# Altium footprint library CeleronLib_THD.PcbLib: 217 footprints (part 13 of 14)
Each footprint in its own frame and in the unit in brackets; x right, y up, seen from the top. Pads: shape width x height; smd on the part's side, far side on the other; paste and mask are expansions set on the pad; w line width, h text height; cw(c..) or ccw(c..) is an arc to the next point about the centre after c.
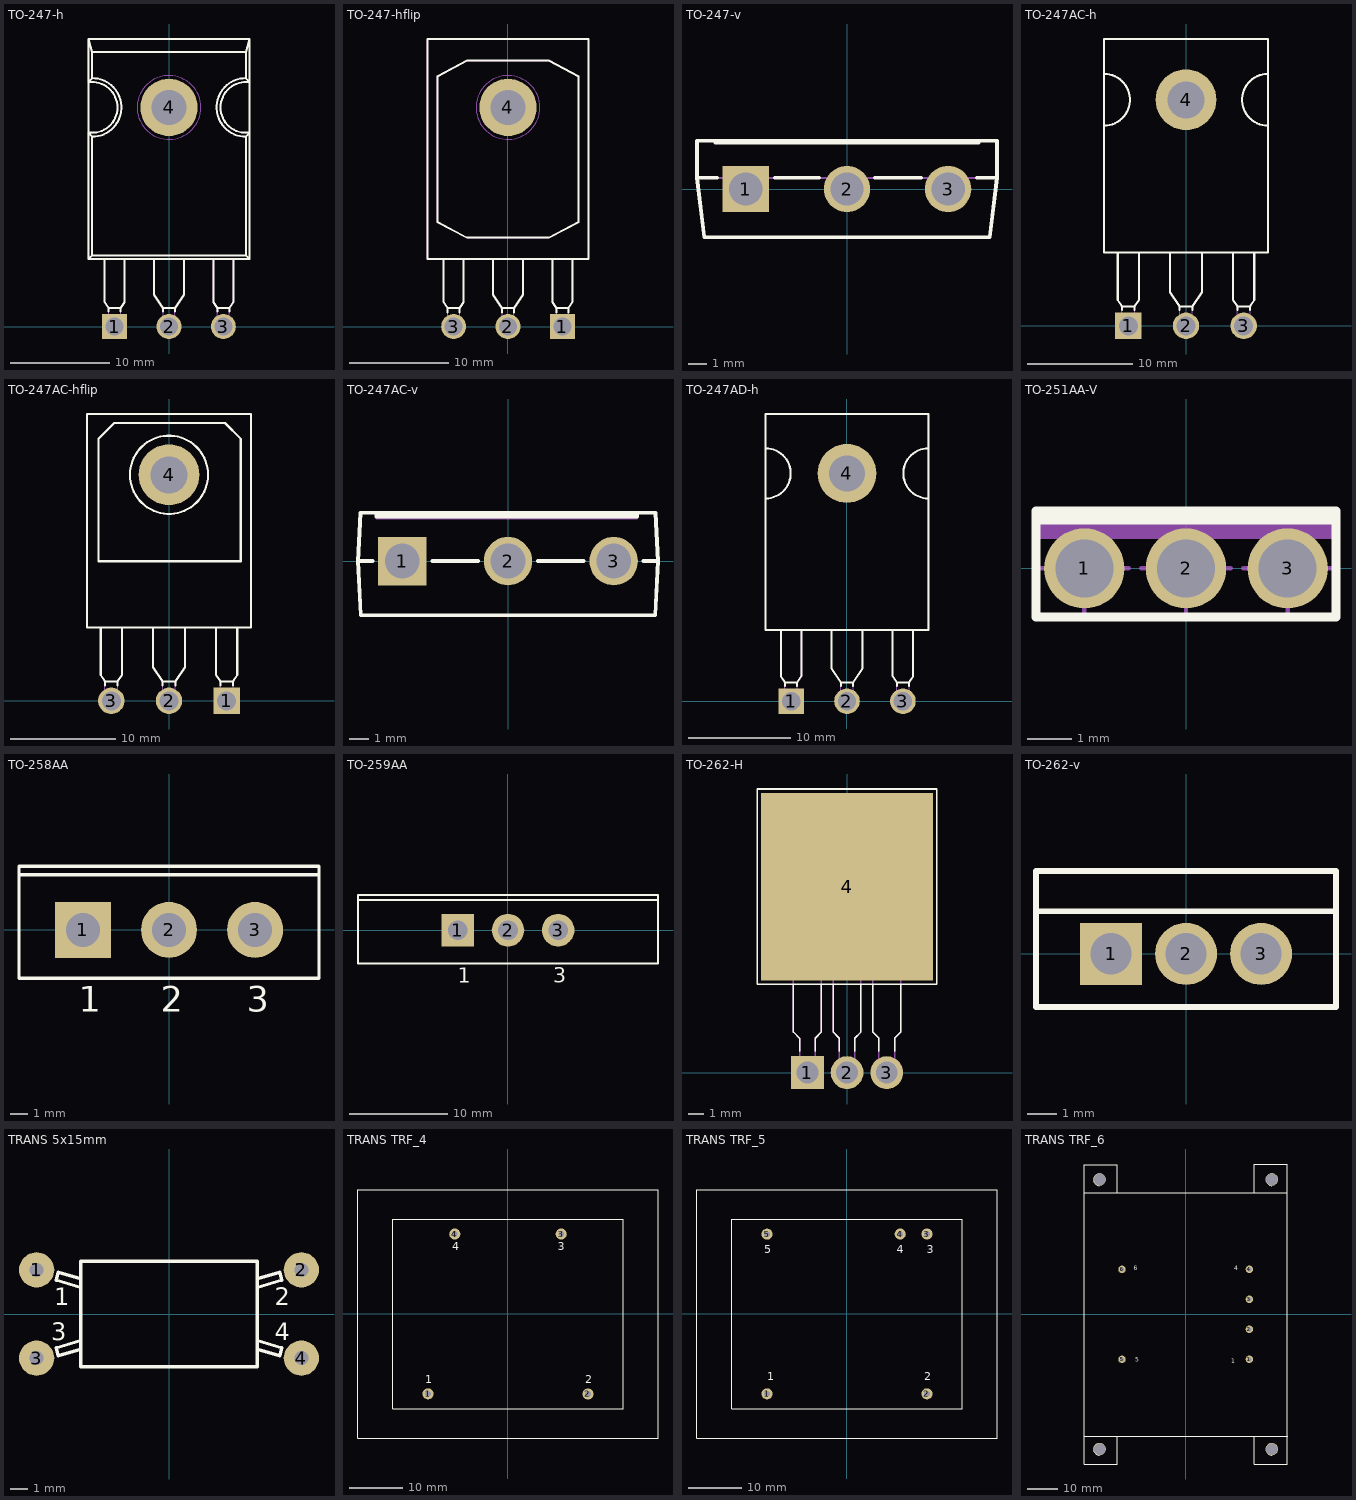
[diagram p12: the footprints below, top view; thin cyan lines are the x and y axes]

## TO-247-h [mm] "TO-247 3-Terminal - Horizontal Mount"
height 5.26
pads (4):
  rect 2.5x2.5 hole 1.8: 1(-5.46,0)
  round 2.5 hole 1.8: 2(0,0) 3(5.46,0)
  round 5.75 hole 3.5: 4(0,22)
Top Overlay:
  lines w0.2: -6.46,6.76 -6.46,2.44 -6.06,1.84 ; -6.06,1.5 -6.06,1.84 ; -4.86,1.5 -4.86,1.84 ; -4.46,6.76 -4.46,2.44 -4.86,1.84 ; -1.5,6.76 -1.5,3.19 -0.6,1.84 ; -0.6,1.5 -0.6,1.84 ; 0.6,1.5 0.6,1.84 ; 1.5,6.76 1.5,3.19 0.6,1.84 ; 4.46,6.76 4.46,2.44 4.86,1.84 ; 4.86,1.5 4.86,1.84 ; 6.06,1.5 6.06,1.84 ; 6.46,6.76 6.46,2.44 6.06,1.84 ; 8.1,19.45 7.71,19.06 ; 8.1,19.49 cw(c7.71,22) 8.1,24.51 7.71,24.94 ; 8.1,28.86 7.71,27.567 ; -8.1,6.76 -8.1,28.86 ; -8.1,6.76 -7.71,7.153 ; -8.1,6.76 8.1,6.76 ; -8.1,28.86 -7.71,27.567 ; -8.1,28.86 8.103,28.869 8.1,6.76 ; -7.71,7.153 -7.71,19.06 ; -7.71,7.153 7.71,7.153 ; -7.71,19.06 ccw(c-7.71,22) -7.71,24.94 ; -7.71,19.06 -8.1,19.49 ccw(c-7.71,22) -8.1,24.51 -7.71,24.94 ; -7.71,24.94 -7.71,27.567 ; -7.71,27.567 7.71,27.567 ; -6.06,1.84 -4.86,1.84 ; -0.6,1.84 0.6,1.84 ; 4.86,1.84 6.06,1.84 ; 7.71,7.153 8.1,6.76 ; 7.71,7.153 7.71,19.06 ; 7.71,19.06 cw(c7.71,22) 7.71,24.94 ; 7.71,24.94 7.71,27.567
Mechanical 8:
  lines w0.1: -6.46,0 -5.46,0 ; -5.46,-1 -5.46,0 ; -5.46,1 -5.46,0 ; -4.46,0 -5.46,0 ; -1,0 0,0 ; -1,22 0,22 ; 0,-1 0,0 ; 0,1 0,0 ; 0,21 0,22 ; 0,23 0,22 ; 1,0 0,0 ; 1,22 0,22 ; 4.46,0 5.46,0 ; 5.46,-1 5.46,0 ; 5.46,1 5.46,0 ; 6.46,0 5.46,0
Top Assy:
  circle w0.1: c0,22 r3.202
  lines w0.1: -6.46,6.76 -6.46,2.44 -6.06,1.84 ; -4.46,6.76 -4.46,2.44 -4.86,1.84 ; -1.5,6.76 -1.5,3.19 -0.6,1.84 ; 1.5,6.76 1.5,3.19 0.6,1.84 ; 4.46,6.76 4.46,2.44 4.86,1.84 ; 6.46,6.76 6.46,2.44 6.06,1.84 ; 8.103,28.869 -8.1,28.86 ; -8.1,6.76 -7.71,7.153 ; -8.1,6.76 -8.1,19.49 ; -8.1,6.76 8.1,6.76 ; -8.1,19.49 ccw(c-7.71,22) -8.1,24.51 ; -8.1,19.49 -7.71,19.06 ; -8.1,24.51 -7.71,24.94 ; -8.1,24.51 -8.1,28.86 ; -8.1,28.86 -7.71,27.567 ; -7.71,7.153 -7.71,19.06 ; -7.71,7.153 7.71,7.153 ; -7.71,19.06 ccw(c-7.71,22) -7.71,24.94 ; -7.71,24.94 -7.71,27.567 ; -7.71,27.567 7.71,27.567 ; -6.06,1.84 -6.06,-0.5 -4.86,-0.5 -4.86,1.84 ; -6.06,1.84 -4.86,1.84 ; -0.6,1.84 -0.6,-0.5 0.6,-0.5 0.6,1.84 ; -0.6,1.84 0.6,1.84 ; 4.86,1.84 4.86,-0.5 6.06,-0.5 6.06,1.84 ; 4.86,1.84 6.06,1.84 ; 7.71,7.153 8.1,6.76 ; 7.71,7.153 7.71,19.06 ; 7.71,19.06 cw(c7.71,22) 7.71,24.94 ; 7.71,19.06 8.1,19.49 ; 7.71,24.94 8.1,24.51 ; 7.71,24.94 7.71,27.567 ; 7.71,27.567 8.1,28.86 8.1,24.51 ; 8.1,6.76 8.1,19.49 ; 8.1,19.49 cw(c7.71,22) 8.1,24.51
3D body: height 5.2, standoff -3.8, extent -8.1,-0.5 8.1,28.86

## TO-247-hflip [mm] "TO-247 3-Terminal - Flipped Horizontal Mount"
height 5.26
pads (4):
  rect 2.5x2.5 hole 1.8: 1(5.46,0)
  round 2.5 hole 1.8: 2(0,0) 3(-5.46,0)
  round 5.75 hole 3.5: 4(0,22)
Top Overlay:
  lines w0.2: -6.46,6.76 -6.46,2.44 -6.06,1.84 ; -6.06,1.429 -6.06,1.84 ; -4.86,1.429 -4.86,1.84 ; -4.46,6.76 -4.46,2.44 -4.86,1.84 ; -1.5,6.76 -1.5,3.19 -0.6,1.84 ; -0.6,1.429 -0.6,1.84 ; 0.6,1.429 0.6,1.84 ; 1.5,6.76 1.5,3.19 0.6,1.84 ; 4.46,6.76 4.46,2.44 4.86,1.84 ; 4.86,1.429 4.86,1.84 ; 6.06,1.429 6.06,1.84 ; 6.46,6.76 6.46,2.44 6.06,1.84 ; 8.1,28.869 8.1,6.76 -8.1,6.76 -8.1,28.86 8.103,28.869 ; -6.06,1.84 -4.86,1.84 ; -0.6,1.84 0.6,1.84 ; 4.86,1.84 6.06,1.84 ; -7.1,10.51 -7.1,25.11 -4.1,26.7 4.1,26.7 7.1,25.11 7.1,10.51 4.1,8.92 -4.1,8.92 -7.1,10.51
Mechanical 8:
  lines w0.1: -5.46,0 -5.46,1 -5.46,0 ; -5.46,0 -5.46,-1 -5.46,0 ; -5.46,0 -4.46,0 -5.46,0 ; -5.46,0 -6.46,0 -5.46,0 ; 0,0 0,1 0,0 ; 0,0 0,-1 0,0 ; 0,0 1,0 0,0 ; 0,0 -1,0 0,0 ; 0,22 0,23 0,22 ; 0,22 0,21 0,22 ; 0,22 1,22 0,22 ; 0,22 -1,22 0,22 ; 5.46,0 5.46,1 5.46,0 ; 5.46,0 5.46,-1 5.46,0 ; 5.46,0 6.46,0 5.46,0 ; 5.46,0 4.46,0 5.46,0
Top Assy:
  circle w0.1: c0,22 r3.202
  lines w0.1: -6.46,6.76 -6.46,2.44 -6.06,1.84 ; -4.46,6.76 -4.46,2.44 -4.86,1.84 ; -1.5,6.76 -1.5,3.19 -0.6,1.84 ; 1.5,6.76 1.5,3.19 0.6,1.84 ; 4.46,6.76 4.46,2.44 4.86,1.84 ; 6.46,6.76 6.46,2.44 6.06,1.84 ; 8.1,28.869 8.1,6.76 -8.1,6.76 -8.1,28.86 8.103,28.869 ; -6.06,1.84 -6.06,-0.5 -4.86,-0.5 -4.86,1.84 ; -6.06,1.84 -4.86,1.84 ; -0.6,1.84 -0.6,-0.5 0.6,-0.5 0.6,1.84 ; -0.6,1.84 0.6,1.84 ; 4.86,1.84 4.86,-0.5 6.06,-0.5 6.06,1.84 ; 4.86,1.84 6.06,1.84 ; -7.1,10.51 -7.1,25.11 -4.1,26.7 4.1,26.7 7.1,25.11 7.1,10.51 4.1,8.92 -4.1,8.92 -7.1,10.51
3D body: height 5.2, standoff -3.8, extent -8.1,-0.5 8.1,28.86

## TO-247-v [mm] "TO-247 3-Terminal - Vertical Mount"
height 25
pads (3):
  rect 2.5x2.5 hole 1.8: 1(-5.46,0)
  round 2.5 hole 1.8: 2(0,0) 3(5.46,0)
Top Overlay:
  lines w0.2: -7.1,2.6 -7.1,2.5 7.1,2.5 7.1,2.6 ; -7,0.6 -8.1,0.6 ; -3.9,0.6 -1.5,0.6 ; 1.5,0.6 4,0.6 ; 7,0.6 8.1,0.6 ; -8.1,0.6 -7.71,-2.6 7.71,-2.6 8.1,0.6 ; -8.1,0.6 -8.1,2.6 8.1,2.6 8.1,0.6
Mechanical 8:
  lines w0.1: -6.46,0 -5.46,0 ; -5.46,-1 -5.46,0 ; -5.46,1 -5.46,0 ; -4.46,0 -5.46,0 ; -1,0 0,0 ; 0,-1 0,0 ; 0,1 0,0 ; 1,0 0,0 ; 4.46,0 5.46,0 ; 5.46,-1 5.46,0 ; 5.46,1 5.46,0 ; 6.46,0 5.46,0
Top Assy:
  lines w0.1: -7.1,2.6 -7.1,2.5 7.1,2.5 7.1,2.6 ; -8.1,0.6 8.1,0.6 ; -8.1,0.6 -7.71,-2.6 7.71,-2.6 8.1,0.6 ; -8.1,0.6 -8.1,2.6 8.1,2.6 8.1,0.6
3D body: height 27.02, standoff -3.6, extent -8.1,-2.6 8.1,2.6

## TO-247AC-h [mm] "TO-247AC 3-Terminal - Horizontal Mount"
height 5.3
pads (4):
  rect 2.5x2.5 hole 1.8: 1(-5.46,0)
  round 2.5 hole 1.8: 2(0,0) 3(5.46,0)
  round 5.75 hole 3.5: 4(0,21.39)
Top Overlay:
  lines w0.2: -7.75,18.94 ccw(c-7.75,21.39) -7.75,23.84 ; -6.46,6.94 -6.46,2.44 -6.06,1.84 ; -6.06,1.5 -6.06,1.84 ; -4.86,1.5 -4.86,1.84 ; -4.46,6.94 -4.46,2.44 -4.86,1.84 ; -1.5,6.94 -1.5,3.19 -0.6,1.84 ; -0.6,1.5 -0.6,1.84 ; 0.6,1.5 0.6,1.84 ; 1.5,6.94 1.5,3.19 0.6,1.84 ; 4.46,6.94 4.46,2.44 4.86,1.84 ; 4.86,1.5 4.86,1.84 ; 6.06,1.5 6.06,1.84 ; 6.46,6.94 6.46,2.44 6.06,1.84 ; 7.75,18.94 cw(c7.75,21.39) 7.75,23.84 ; -6.06,1.84 -4.86,1.84 ; -0.6,1.84 0.6,1.84 ; 4.86,1.84 6.06,1.84 ; -7.75,6.94 7.75,6.94 7.75,27.14 -7.75,27.14 -7.75,6.94
Mechanical 8:
  lines w0.1: -5.96,0 -5.46,0 ; -5.46,-0.5 -5.46,0 ; -5.46,0.5 -5.46,0 ; -4.96,0 -5.46,0 ; -0.5,0 0,0 ; -0.5,21.39 0,21.39 ; 0,-0.5 0,0 ; 0,0.5 0,0 ; 0,20.89 0,21.39 ; 0,21.89 0,21.39 ; 0.5,0 0,0 ; 0.5,21.39 0,21.39 ; 4.96,0 5.46,0 ; 5.46,-0.5 5.46,0 ; 5.46,0.5 5.46,0 ; 5.96,0 5.46,0
Top Assy:
  circle w0.1: c0,21.39 r1.75
  lines w0.1: -7.75,18.94 ccw(c-7.75,21.39) -7.75,23.84 ; -6.46,6.94 -6.46,2.44 -6.06,1.84 ; -4.46,6.94 -4.46,2.44 -4.86,1.84 ; -1.5,6.94 -1.5,3.19 -0.6,1.84 ; 1.5,6.94 1.5,3.19 0.6,1.84 ; 4.46,6.94 4.46,2.44 4.86,1.84 ; 6.46,6.94 6.46,2.44 6.06,1.84 ; 7.75,18.94 cw(c7.75,21.39) 7.75,23.84 ; -6.06,1.84 -6.06,-0.5 -4.86,-0.5 -4.86,1.84 ; -6.06,1.84 -4.86,1.84 ; -0.6,1.84 -0.6,-0.5 0.6,-0.5 0.6,1.84 ; -0.6,1.84 0.6,1.84 ; 4.86,1.84 6.06,1.84 ; 4.86,1.84 4.86,-0.5 6.06,-0.5 6.06,1.84 ; -7.75,6.94 -7.75,27.14 7.75,27.14 7.75,6.94 -7.75,6.94
3D body: height 5.3, standoff -3.9, extent -7.75,-0.5 7.75,27.14

## TO-247AC-hflip [mm] "TO-247AC 3-Terminal - Flipped Horizontal Mount"
height 5.3
pads (4):
  rect 2.5x2.5 hole 1.8: 1(5.46,0)
  round 2.5 hole 1.8: 2(0,0) 3(-5.46,0)
  round 5.75 hole 3.5: 4(0,21.39)
Top Overlay:
  circle w0.2: c0,21.39 r3.7
  lines w0.2: -6.46,6.94 -6.46,2.44 -6.06,1.84 ; -6.06,1.429 -6.06,1.84 ; -4.86,1.429 -4.86,1.84 ; -4.46,6.94 -4.46,2.44 -4.86,1.84 ; -1.5,6.94 -1.5,3.19 -0.6,1.84 ; -0.6,1.429 -0.6,1.84 ; 0.6,1.429 0.6,1.84 ; 1.5,6.94 1.5,3.19 0.6,1.84 ; 4.46,6.94 4.46,2.44 4.86,1.84 ; 4.86,1.429 4.86,1.84 ; 6.06,1.429 6.06,1.84 ; 6.46,6.94 6.46,2.44 6.06,1.84 ; -6.06,1.84 -4.86,1.84 ; -0.6,1.84 0.6,1.84 ; 4.86,1.84 6.06,1.84 ; -7.75,6.94 -7.75,27.14 7.75,27.14 7.75,6.94 -7.75,6.94 ; -6.665,13.21 -6.665,24.79 -5.165,26.29 5.295,26.29 6.795,24.79 6.795,13.21 -6.665,13.21
Mechanical 8:
  lines w0.1: -5.96,0 -5.46,0 ; -5.46,-0.5 -5.46,0 ; -5.46,0.5 -5.46,0 ; -4.96,0 -5.46,0 ; -0.5,0 0,0 ; -0.5,21.39 0,21.39 ; 0,-0.5 0,0 ; 0,0.5 0,0 ; 0,20.89 0,21.39 ; 0,21.89 0,21.39 ; 0.5,0 0,0 ; 0.5,21.39 0,21.39 ; 4.96,0 5.46,0 ; 5.46,-0.5 5.46,0 ; 5.46,0.5 5.46,0 ; 5.96,0 5.46,0
Top Assy:
  circle w0.1: c0,21.39 r1.75
  circle w0.1: c0,21.39 r3.7
  lines w0.1: -6.46,6.94 -6.46,2.44 -6.06,1.84 ; -4.46,6.94 -4.46,2.44 -4.86,1.84 ; -1.5,6.94 -1.5,3.19 -0.6,1.84 ; 1.5,6.94 1.5,3.19 0.6,1.84 ; 4.46,6.94 4.46,2.44 4.86,1.84 ; 6.46,6.94 6.46,2.44 6.06,1.84 ; -6.06,1.84 -6.06,-0.5 -4.86,-0.5 -4.86,1.84 ; -6.06,1.84 -4.86,1.84 ; -0.6,1.84 -0.6,-0.5 0.6,-0.5 0.6,1.84 ; -0.6,1.84 0.6,1.84 ; 4.86,1.84 6.06,1.84 ; 4.86,1.84 4.86,-0.5 6.06,-0.5 6.06,1.84 ; -7.75,6.94 -7.75,27.14 7.75,27.14 7.75,6.94 -7.75,6.94 ; -6.665,13.21 -6.665,24.79 -5.165,26.29 5.295,26.29 6.795,24.79 6.795,13.21 -6.665,13.21
3D body: height 5.3, standoff -3.6, extent -7.75,-0.5 7.75,27.14

## TO-247AC-v [mm] "TO-247AC 3-Terminal - Vertical Mount"
height 25
pads (3):
  rect 2.5x2.5 hole 1.8: 1(-5.46,0)
  round 2.5 hole 1.8: 2(0,0) 3(5.46,0)
Top Overlay:
  lines w0.2: -7.728,0 -7.01,0 ; -6.795,2.5 -6.795,2.3 6.665,2.3 6.665,2.5 ; -3.91,0 -1.55,0 ; 1.55,0 3.91,0 ; 7.01,0 7.75,0 ; 7.75,0 7.61,-2.8 -7.61,-2.8 -7.75,0 -7.62,2.5 7.62,2.5 7.75,0
Mechanical 8:
  lines w0.1: -5.96,0 -5.46,0 ; -5.46,-0.5 -5.46,0 ; -5.46,0.5 -5.46,0 ; -4.96,0 -5.46,0 ; -0.5,0 0,0 ; 0,-0.5 0,0 ; 0,0.5 0,0 ; 0.5,0 0,0 ; 4.96,0 5.46,0 ; 5.46,-0.5 5.46,0 ; 5.46,0.5 5.46,0 ; 5.96,0 5.46,0
Top Assy:
  lines w0.1: -6.795,2.3 6.665,2.3 ; -6.795,2.4 6.665,2.4 ; -6.795,2.5 -6.795,2.2 6.665,2.2 6.665,2.5 ; -7.75,0 -7.61,-2.8 7.61,-2.8 7.75,0 7.62,2.5 -7.62,2.5 -7.75,0
3D body: height 26.75, standoff -3.6, extent -7.75,-2.8 7.75,2.5

## TO-247AD-h [mm] "TO-247AD 3-Terminal - Horizontal Mount"
height 5.3
pads (4):
  rect 2.5x2.5 hole 1.8: 1(-5.46,0)
  round 2.5 hole 1.8: 2(0,0) 3(5.46,0)
  round 5.75 hole 3.5: 4(0,22.24)
Top Overlay:
  lines w0.2: -7.95,19.79 ccw(c-7.95,22.24) -7.95,24.69 ; -6.46,6.94 -6.46,2.44 -6.06,1.84 ; -6.06,1.5 -6.06,1.84 ; -4.86,1.5 -4.86,1.84 ; -4.46,6.94 -4.46,2.44 -4.86,1.84 ; -1.5,6.94 -1.5,3.19 -0.6,1.84 ; -0.6,1.5 -0.6,1.84 ; 0.6,1.5 0.6,1.84 ; 1.5,6.94 1.5,3.19 0.6,1.84 ; 4.46,6.94 4.46,2.44 4.86,1.84 ; 4.86,1.5 4.86,1.84 ; 6.06,1.5 6.06,1.84 ; 6.46,6.94 6.46,2.44 6.06,1.84 ; 7.95,19.79 cw(c7.95,22.24) 7.95,24.69 ; -6.06,1.84 -4.86,1.84 ; -0.6,1.84 0.6,1.84 ; 4.86,1.84 6.06,1.84 ; -7.95,6.94 7.95,6.94 7.95,28.04 -7.95,28.04 -7.95,6.94
Mechanical 8:
  lines w0.1: -5.96,0 -5.46,0 ; -5.46,-0.5 -5.46,0 ; -5.46,0.5 -5.46,0 ; -4.96,0 -5.46,0 ; -0.5,0 0,0 ; -0.5,22.24 0,22.24 ; 0,-0.5 0,0 ; 0,0.5 0,0 ; 0,21.74 0,22.24 ; 0,22.74 0,22.24 ; 0.5,0 0,0 ; 0.5,22.24 0,22.24 ; 4.96,0 5.46,0 ; 5.46,-0.5 5.46,0 ; 5.46,0.5 5.46,0 ; 5.96,0 5.46,0
Top Assy:
  circle w0.1: c0,22.24 r1.75
  lines w0.1: -7.95,19.79 ccw(c-7.95,22.24) -7.95,24.69 ; -6.46,6.94 -6.46,2.44 -6.06,1.84 ; -4.46,6.94 -4.46,2.44 -4.86,1.84 ; -1.5,6.94 -1.5,3.19 -0.6,1.84 ; 1.5,6.94 1.5,3.19 0.6,1.84 ; 4.46,6.94 4.46,2.44 4.86,1.84 ; 6.46,6.94 6.46,2.44 6.06,1.84 ; 7.95,19.79 cw(c7.95,22.24) 7.95,24.69 ; -6.06,1.84 -4.86,1.84 ; -6.06,1.84 -6.06,-0.5 -4.86,-0.5 -4.86,1.84 ; -0.6,1.84 0.6,1.84 ; -0.6,1.84 -0.6,-0.5 0.6,-0.5 0.6,1.84 ; 4.86,1.84 4.86,-0.5 6.06,-0.5 6.06,1.84 ; 4.86,1.84 6.06,1.84 ; -7.95,6.94 7.95,6.94 7.95,28.04 -7.95,28.04 -7.95,6.94
3D body: height 5.3, standoff -3.9, extent -7.95,-0.5 7.95,28.04

## TO-251AA-V [mm] "TO-251AA 3-Terminal - Vertical Mount"
height 10.5
pads (3):
  round 1.8 hole 1.3: 1(-2.28,0) 2(0,0) 3(2.28,0)
Top Overlay:
  lines w0.2: -3.365,1.09 3.365,1.09 ; -3.365,-1.09 -3.365,1.29 3.365,1.29 3.365,-1.09 -3.365,-1.09
Mechanical 8:
  lines w0.1: -3.28,0 -2.28,0 ; -2.28,-1 -2.28,0 ; -2.28,1 -2.28,0 ; -1.28,0 -2.28,0 ; -1,0 0,0 ; 0,-1 0,0 ; 0,1 0,0 ; 1,0 0,0 ; 1.28,0 2.28,0 ; 2.28,-1 2.28,0 ; 2.28,1 2.28,0 ; 3.28,0 2.28,0
Top Assy:
  lines w0.1: -3.365,0.71 3.365,0.71 ; -3.365,0.79 3.365,0.79 ; -3.365,0.89 3.365,0.89 ; -3.365,0.99 3.365,0.99 ; -3.365,1.09 3.365,1.09 ; -3.365,1.19 3.365,1.19 ; -3.365,-1.09 3.365,-1.09 3.365,1.29 -3.365,1.29 -3.365,-1.09
3D body: height 10.49, standoff -3.2, extent -3.365,-1.09 3.365,1.29

## TO-258AA [mm] "TO, Thru-Hole, Vertical, Heatsink Mounted; 3 In-Line Leads; Pitch 5.08 mm"
height 21
pads (3):
  rect 3.3x3.3 hole 2: 1(-5.08,0)
  round 3.3 hole 2: 2(0,0) 3(5.08,0)
Top Overlay:
  lines w0.2: -8.85,3.25 8.85,3.25 ; -8.85,-2.85 -8.85,3.75 8.85,3.75 8.85,-2.85 -8.85,-2.85
  text "3" at 4.58,-4.825 h1.5
  text "2" at -0.5,-4.825 h1.5
  text "1" at -5.33,-4.825 h1.5

## TO-259AA [mm] "SIP; 3 Leads; Body 13.7 x 30.2 x 6.5 mm (typ); Pitch 5.08 mm"
height 14
pads (3):
  rect 3.3x3.3 hole 2: 1(-5.08,0)
  round 3.3 hole 2: 2(0,0) 3(5.08,0)
Top Overlay:
  lines w0.2: -15.2,3.05 15.2,3.05 ; -15.2,-3.35 -15.2,3.55 15.2,3.55 15.2,-3.35 -15.2,-3.35
  text "3" at 4.572,-5.33 h1.5
  text "1" at -5.08,-5.33 h1.5

## TO-262-H [mm] "TO-262 3-Terminal + Tab - Horizontal Mount"
height 4.83
pads (4):
  rect 2.1x2.1 hole 1.4: 1(-2.54,0)
  round 2.1 hole 1.4: 2(0,0) 3(2.54,0)
  rect 11x12 smd paste-5.5: 4(-0.002,11.898)
Top Overlay:
  lines w0.1: -3.43,5.648 -3.43,2.59 -3.04,2.2 -3.04,1.361 ; -2.04,1.361 -2.04,2.2 -1.65,2.59 -1.65,5.648 ; -0.89,5.648 -0.89,2.59 -0.5,2.2 -0.5,1.361 ; 0.5,1.361 0.5,2.2 0.89,2.59 0.89,5.648 ; 1.65,5.648 1.65,2.59 2.04,2.2 2.04,1.361 ; 3.04,1.361 3.04,2.2 3.43,2.59 3.43,5.648 ; -5.752,5.648 -5.752,18.148 5.748,18.148 5.748,5.648 -5.752,5.648
Mechanical 8:
  lines w0.1: -3.04,0 -2.54,0 ; -2.54,-0.5 -2.54,0 ; -2.54,0.5 -2.54,0 ; -2.04,0 -2.54,0 ; -0.5,0 0,0 ; 0,-0.5 0,0 ; 0,0.5 0,0 ; 0.5,0 0,0 ; 2.04,0 2.54,0 ; 2.54,-0.5 2.54,0 ; 2.54,0.5 2.54,0 ; 3.04,0 2.54,0
  text "This Pad" at -3.8,9.75 h1
  text "Mask on" at -3.5,11.425 h1
  text "No Paste" at -3.725,13 h1
Top 3D:
  lines w0.2: -5.083,6.7 -5.083,6.3 -4.5,6.3
Top Assy:
  lines w0.1: -5.083,15.815 5.077,15.815 ; -3.43,6.3 -3.43,2.59 -3.04,2.2 -3.04,-0.25 -2.04,-0.25 -2.04,2.2 -1.65,2.59 -1.65,6.3 ; -0.89,6.3 -0.89,2.59 -0.5,2.2 -0.5,-0.25 0.5,-0.25 0.5,2.2 0.89,2.59 0.89,6.3 ; 1.65,6.3 1.65,2.59 2.04,2.2 2.04,-0.25 3.04,-0.25 3.04,2.2 3.43,2.59 3.43,6.3 ; -5.083,6.3 -5.083,16.86 -3.338,17.495 3.333,17.495 5.077,16.86 5.077,6.3 -5.083,6.3
3D body: height 4.6, standoff -3.6, extent -5.082,-0.25 5.078,17.495

## TO-262-v [mm] "TO-262 3-Terminal - Vertical Mount"
height 15.01
pads (3):
  rect 2.1x2.1 hole 1.4: 1(-2.54,0)
  round 2.1 hole 1.4: 2(0,0) 3(2.54,0)
Top Overlay:
  lines w0.2: -5.082,1.445 5.078,1.445 ; -5.082,-1.795 5.078,-1.795 5.078,2.805 -5.082,2.805 -5.082,-1.795
Mechanical 8:
  lines w0.1: -3.04,0 -2.54,0 ; -2.54,-0.5 -2.54,0 ; -2.54,0.5 -2.54,0 ; -2.04,0 -2.54,0 ; -0.5,0 0,0 ; 0,-0.5 0,0 ; 0,0.5 0,0 ; 0.5,0 0,0 ; 2.04,0 2.54,0 ; 2.54,-0.5 2.54,0 ; 2.54,0.5 2.54,0 ; 3.04,0 2.54,0
Top Assy:
  lines w0.1: -5.082,1.445 5.078,1.445 ; -5.082,-1.795 5.078,-1.795 5.078,2.805 -5.082,2.805 -5.082,-1.795
3D body: height 15.3, standoff -3.6, extent -5.082,-1.795 5.078,2.805

## TRANS 5x15mm [mm] "Transformer; 4 Leads"
pads (4):
  round 2 hole 0.8: 1(-7.5,2.5) 2(7.5,2.5) 3(-7.5,-2.5) 4(7.5,-2.5)
Top Overlay:
  lines w0.2: -5,-2 -6.275,-2.375 -6.4,-1.925 -5,-1.5 ; -5,1.5 -6.4,1.925 -6.275,2.375 -5,2 ; 5,-2 6.275,-2.375 6.4,-1.925 5,-1.5 ; 5,1.5 6.4,1.925 6.275,2.375 5,2 ; -5,-3 5,-3 5,3 -5,3 -5,-3
  text "1" at -6.5,0.5 h1
  text "2" at 6,0.5 h1
  text "3" at -6.675,-1.5 h1
  text "4" at 6,-1.5 h1

## TRANS TRF_4 [mil] "Transformer; 4 Leads"
pads (4):
  round 82 hole 42: 1(-590.83,-590) 2(590.83,-590.83) 3(393.33,590.83) 4(-393.33,590.83)
Top Overlay:
  lines w8: -1108.33,-916.67 1108.33,-916.67 1108.33,916.67 -1108.33,916.67 -1108.33,-916.67 ; -850,-700 -850,700 850,700 850,-700 -850,-700
  text "1" at -610.83,-510 h59.06
  text "2" at 569.17,-510 h59.06
  text "4" at -410.83,470 h59.06
  text "3" at 369.17,470 h59.06

## TRANS TRF_5 [mil] "Transformer; 5 Leads"
pads (5):
  round 82 hole 42: 1(-590.83,-590.42) 2(590.83,-590.42) 3(590.83,590.42) 4(393.33,590.42) 5(-590.83,589.58)
Top Overlay:
  lines w8: -1108.33,-917.08 1108.33,-917.08 1108.33,916.25 -1108.33,916.25 -1108.33,-917.08 ; -850,-700.42 -850,699.58 850,699.58 850,-700.42 -850,-700.42
  text "2" at 569.17,-490.42 h59.06
  text "3" at 589.17,449.58 h59.06
  text "4" at 369.17,449.58 h59.06
  text "1" at -590.83,-490.42 h59.06
  text "5" at -610.83,449.58 h59.06

## TRANS TRF_6 [mil] "Transformer; 6 Leads"
pads (10):
  round 98 hole 52: 1(836.67,-590.83) 2(836.67,-196.67) 3(836.67,196.67) 4(836.67,590.83) 5(-836.67,-590.83) 6(-836.67,590.83)
  round 165 hole 152: MH1(-1131.67,-1771.67) MH2(1131.67,-1771.67) MH3(1131.67,1771.67) MH4(-1131.67,1771.67)
Top Overlay:
  lines w8: -1333.33,-1600 1341.67,-1600 ; -1333.33,1600 1333.33,1600 ; -1133.33,-1850 cw(c-1133.33,-1775) -1133.33,-1700 ; -1133.33,1691.67 cw(c-1133.33,1766.67) -1133.33,1841.67 ; -900,-1600 -900,-1966.67 -1333.33,-1966.67 -1333.33,1966.67 -900,1966.67 -900,1600 ; 900,-1600 900,-1966.67 1333.33,-1966.67 1333.33,1966.67 ; 900,1600 900,1975 1333.33,1975 ; 1133.33,-1850 cw(c1133.33,-1775) 1133.33,-1700 ; 1133.33,1691.67 cw(c1133.33,1766.67) 1133.33,1841.67
  text "5" at -660,-620 h59.06
  text "1" at 600,-640 h59.06
  text "4" at 640,580 h59.06
  text "6" at -680,580 h59.06